# Altium integrated library RF Module.IntLib: 92 symbols (part 2 of 2)
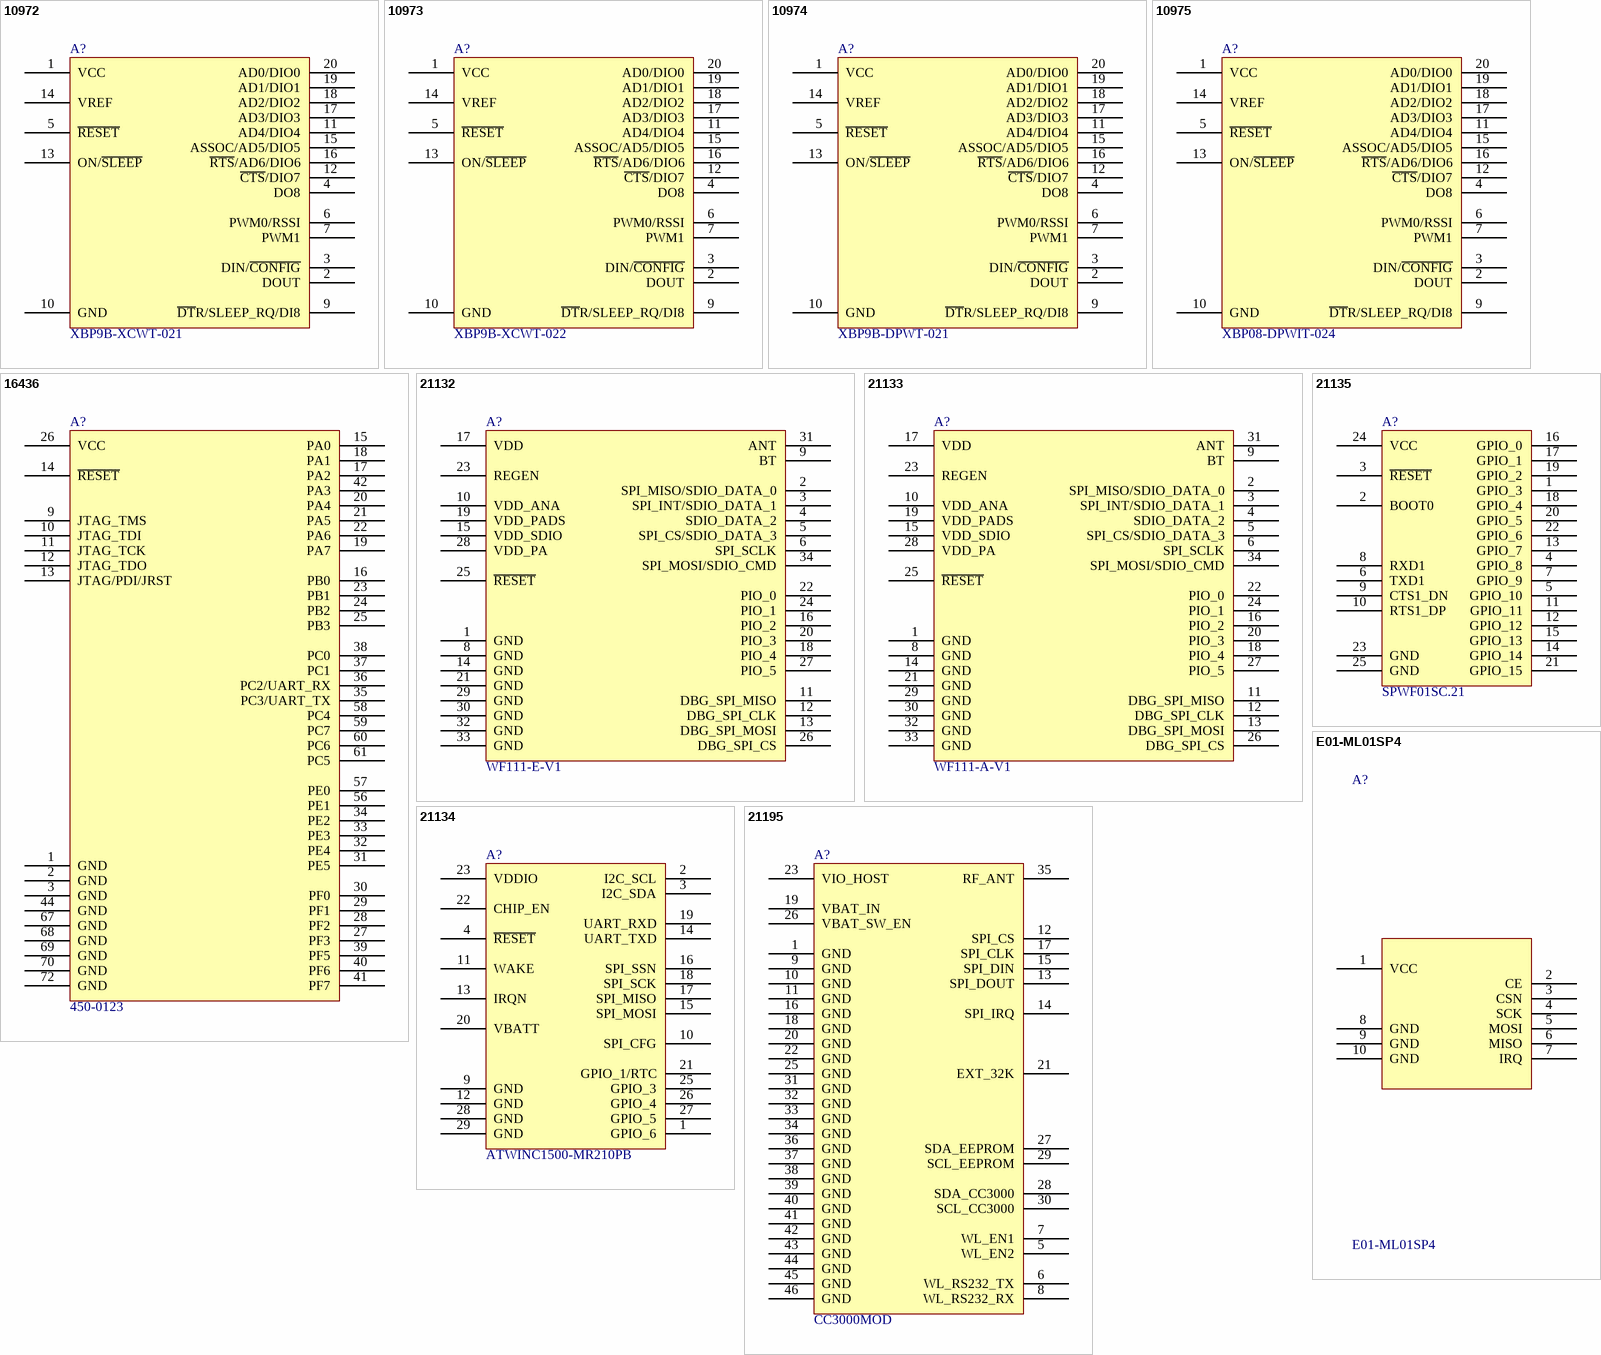
[diagram p7: symbols 10972 to E01-ML01SP4]

## 21134
designator A?, comment ATWINC1500-MR210PB
RF TXRX MODULE WIFI TRACE ANT; Manufacturer: Atmel; Protocol: 802.11b/g/n; Frequency: 2.4GHz; DataRate: 72.2Mbps; Power - Output: 19.5dBm; Sensitivity: -98dBm; Serial Interfaces: IC, SPI, UART; Antenna Type: Integrated, Trace; Memory Size: 4MB Flash, 128kB RAM; Voltage - Supply: 3 V ~ 4.2 V; Current - Receiving: 52.5mA ~ 70.1mA; Current - Transmitting: 132mA ~ 294mA; PartId: 21134; Part Number: ATWINC1500-MR210PB; Supplier 1: Digi-Key; Supplier Part Number 1: ATWINC1500-MR210PB-ND; ComponentLink1Description: Datasheet; ComponentLink1URL: http://www.atmel.com/images/atmel-42502-smartconnect-winc1500-mr210pb_datasheet.pdf; ComponentLink2Description: Digi-Key Listing; ComponentLink2URL: http://www.digikey.com/product-search/en?keywords=ATWINC1500-MR210PB; Price: 16.3; Type: RF Transceiver Modules; Device Package: Module; Operating Temperature: -40C ~ 85C; RF Family/Standard: WiFi; Mounting Type: Surface Mount
footprint ATMEL ATWINC1500-MR210PB
pins: 1 GPIO_6, 2 I2C_SCL, 3 I2C_SDA, 4 ~{RESET}, 9 GND, 10 SPI_CFG, 11 WAKE, 12 GND, 13 IRQN, 14 UART_TXD, 15 SPI_MOSI, 16 SPI_SSN, 17 SPI_MISO, 18 SPI_SCK, 19 UART_RXD, 20 VBATT, 21 GPIO_1/RTC, 22 CHIP_EN, 23 VDDIO, 25 GPIO_3, 26 GPIO_4, 27 GPIO_5, 28 GND, 29 GND

## 21135
designator A?, comment SPWF01SC.21
RF TXRX MODULE WIFI U.FL ANT; Manufacturer: STMicroelectronics; Protocol: 802.11b/g/n; Modulation: DSSS, OFDM; Frequency: 2.4GHz; DataRate: 65Mbps; Power - Output: 18.3dBm; Sensitivity: -96dBm; Serial Interfaces: UART; Antenna Type: Not Included, U.FL; Memory Size: 512kB Flash, 64kB RAM; Voltage - Supply: 3.3V; Current - Receiving: 105mA; Current - Transmitting: 210mA ~ 344mA; PartId: 21135; Part Number: SPWF01SC.21; Supplier 1: Digi-Key; Supplier Part Number 1: 497-14639-ND; ComponentLink1Description: Datasheet; ComponentLink1URL: http://www.st.com/web/en/resource/technical/document/datasheet/DM00102124.pdf; ComponentLink2Description: Digi-Key Listing; ComponentLink2URL: http://www.digikey.com/product-search/en?keywords=SPWF01SC.21; Price: 19.11; Type: RF Transceiver Modules; Device Package: Module; Operating Temperature: -40C ~ 85C; RF Family/Standard: WiFi; Mounting Type: Surface Mount
footprint ST SPWF01SC.21
pins: 1 GPIO_3, 2 BOOT0, 3 ~{RESET}, 4 GPIO_8, 5 GPIO_10, 6 TXD1, 7 GPIO_9, 8 RXD1, 9 CTS1_DN, 10 RTS1_DP, 11 GPIO_11, 12 GPIO_12, 13 GPIO_7, 14 GPIO_14, 15 GPIO_13, 16 GPIO_0, 17 GPIO_1, 18 GPIO_4, 19 GPIO_2, 20 GPIO_5, 21 GPIO_15, 22 GPIO_6, 23 GND, 24 VCC, 25 GND

## 21195
designator A?, comment CC3000MOD
RF TXRX MODULE WIFI CHIP ANT; Manufacturer: Texas Instruments; Protocol: 802.11b/g; Modulation: CCK, DSSS, OFDM; Frequency: 2.4GHz; DataRate: 54Mbps; Power - Output: 18.3dBm; Sensitivity: -97.5dBm; Serial Interfaces: IC, SPI, UART; Antenna Type: Integrated, Chip; Voltage - Supply: 1.8 V ~ 3.6 V; Current - Receiving: 92mA; Current - Transmitting: 190mA ~ 260mA; PartId: 21195; Part Number: CC3000MOD; Supplier 1: Digi-Key; Supplier Part Number 1: 296-35057-ND; ComponentLink1Description: Datasheet; ComponentLink1URL: http://www.ti.com/lit/ds/symlink/cc3000.pdf; ComponentLink2Description: Digi-Key Listing; ComponentLink2URL: http://www.digikey.com/product-detail/en/texas-instruments/CC3000MOD/296-35057-ND/3725883; Price: 42.46; Type: RF Transceiver Modules; Device Package: Module; Operating Temperature: -20C ~ 70C; RF Family/Standard: WiFi; Memory Size: -; Mounting Type: Surface Mount
footprint TI CC3000
pins: 1 GND, 5 WL_EN2, 6 WL_RS232_TX, 7 WL_EN1, 8 WL_RS232_RX, 9 GND, 10 GND, 11 GND, 12 SPI_CS, 13 SPI_DOUT, 14 SPI_IRQ, 15 SPI_DIN, 16 GND, 17 SPI_CLK, 18 GND, 19 VBAT_IN, 20 GND, 21 EXT_32K, 22 GND, 23 VIO_HOST, 25 GND, 26 VBAT_SW_EN, 27 SDA_EEPROM, 28 SDA_CC3000, 29 SCL_EEPROM, 30 SCL_CC3000, 31 GND, 32 GND, 33 GND, 34 GND, 35 RF_ANT, 36 GND, 37 GND, 38 GND, 39 GND, 40 GND, 41 GND, 42 GND, 43 GND, 44 GND, 45 GND, 46 GND

## E01-ML01SP4
designator A?
RF TXRX MODULE 2.4GHZ EXT ANT SPI; Manufacturer: EBYTE; Antenna Type: External; Voltage - Supply: 2.0 V ~ 3.6 V; Current - Receiving: 27mA; Part Number: E01-ML01SP4; ComponentLink1Description: Datasheet; ComponentLink1URL: http://www.ebyte.com/en/pdf-down.aspx?id=895; Type: RF Transceiver Modules; Device Package: Module; Operating Temperature: -20C ~ 70C; Frequency: 2.4GHz; Serial Interfaces: SPI; Memory Size: -; Mounting Type: Surface Mount
footprint EBYTE E01-ML01SP4
pins: 1 VCC, 2 CE, 3 CSN, 4 SCK, 5 MOSI, 6 MISO, 7 IRQ, 8 GND, 9 GND, 10 GND

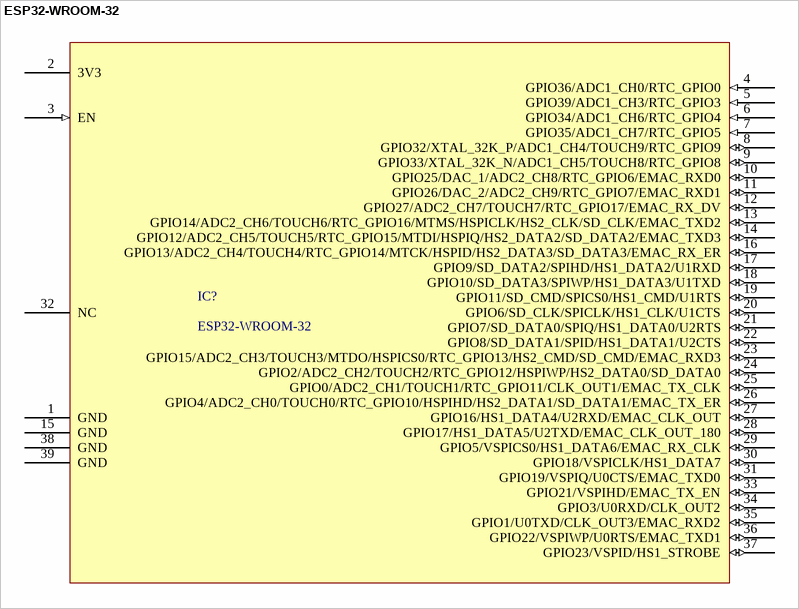
[diagram p6: symbol ESP32-WROOM-32]

## ESP32-WROOM-32
designator IC?
MODULE ESP32 WIFI/BT; Manufacturer: Espressif Systems; Antenna Type: Integrated, On Board; Frequency: 2.4Ghz; Modulation: CCK, DSSS, OFDM; Protocols: 802.11b/g/n, Bluetooth v4.2 + EDR, Class 1, 2 and 3; Device Package: Module; Mounting Type: Surface Mount; Operating Temperature: -40'C ~ +80'C; Part Number: ESP32-WROOM-32; Price: 6.08$; ComponentLink1Description: Datasheet; ComponentLink1URL: https://www.espressif.com/sites/default/files/documentation/esp32-wroom-32d_esp32-wroom-32u_datasheet_en.pdf; ComponentLink2Description: Digi-Key Listing; ComponentLink2URL: https://www.digikey.com/product-detail/en/espressif-systems/ESP32-WROOM-32D/1904-1023-2-ND/9381716
footprint ESP32-WROOM-32 (Hybrid Wi-Fi & Bluetooth Chip)
pins: 1 GND (power), 2 3V3, 3 EN (in), 4 GPIO36/ADC1_CH0/RTC_GPIO0 (in), 5 GPIO39/ADC1_CH3/RTC_GPIO3 (in), 6 GPIO34/ADC1_CH6/RTC_GPIO4 (in), 7 GPIO35/ADC1_CH7/RTC_GPIO5 (in), 8 GPIO32/XTAL_32K_P/ADC1_CH4/TOUCH9/RTC_GPIO9 (io), 9 GPIO33/XTAL_32K_N/ADC1_CH5/TOUCH8/RTC_GPIO8 (io), 10 GPIO25/DAC_1/ADC2_CH8/RTC_GPIO6/EMAC_RXD0 (io), 11 GPIO26/DAC_2/ADC2_CH9/RTC_GPIO7/EMAC_RXD1 (io), 12 GPIO27/ADC2_CH7/TOUCH7/RTC_GPIO17/EMAC_RX_DV (io), 13 GPIO14/ADC2_CH6/TOUCH6/RTC_GPIO16/MTMS/HSPICLK/HS2_CLK/SD_CLK/EMAC_TXD2 (io), 14 GPIO12/ADC2_CH5/TOUCH5/RTC_GPIO15/MTDI/HSPIQ/HS2_DATA2/SD_DATA2/EMAC_TXD3 (io), 15 GND (power), 16 GPIO13/ADC2_CH4/TOUCH4/RTC_GPIO14/MTCK/HSPID/HS2_DATA3/SD_DATA3/EMAC_RX_ER (io), 17 GPIO9/SD_DATA2/SPIHD/HS1_DATA2/U1RXD (io), 18 GPIO10/SD_DATA3/SPIWP/HS1_DATA3/U1TXD (io), 19 GPIO11/SD_CMD/SPICS0/HS1_CMD/U1RTS (io), 20 GPIO6/SD_CLK/SPICLK/HS1_CLK/U1CTS (io), 21 GPIO7/SD_DATA0/SPIQ/HS1_DATA0/U2RTS (io), 22 GPIO8/SD_DATA1/SPID/HS1_DATA1/U2CTS (io), 23 GPIO15/ADC2_CH3/TOUCH3/MTDO/HSPICS0/RTC_GPIO13/HS2_CMD/SD_CMD/EMAC_RXD3 (io), 24 GPIO2/ADC2_CH2/TOUCH2/RTC_GPIO12/HSPIWP/HS2_DATA0/SD_DATA0 (io), 25 GPIO0/ADC2_CH1/TOUCH1/RTC_GPIO11/CLK_OUT1/EMAC_TX_CLK (io), 26 GPIO4/ADC2_CH0/TOUCH0/RTC_GPIO10/HSPIHD/HS2_DATA1/SD_DATA1/EMAC_TX_ER (io), 27 GPIO16/HS1_DATA4/U2RXD/EMAC_CLK_OUT (io), 28 GPIO17/HS1_DATA5/U2TXD/EMAC_CLK_OUT_180 (io), 29 GPIO5/VSPICS0/HS1_DATA6/EMAC_RX_CLK (io), 30 GPIO18/VSPICLK/HS1_DATA7 (io), 31 GPIO19/VSPIQ/U0CTS/EMAC_TXD0 (io), 32 NC, 33 GPIO21/VSPIHD/EMAC_TX_EN (io), 34 GPIO3/U0RXD/CLK_OUT2 (io), 35 GPIO1/U0TXD/CLK_OUT3/EMAC_RXD2 (io), 36 GPIO22/VSPIWP/U0RTS/EMAC_TXD1 (io), 37 GPIO23/VSPID/HS1_STROBE (io), 38 GND (power), 39 GND (power)